# Altium schematic symbol library TI Amplifiers and Linear Special Function Amplifier.SchLib: 708 symbols (part 1 of 34) (continued)
## DRV102TG3 (continued)

## DRV103H
designator U?
PWM Low Side Driver (3 A) for Solenoids, Coils, Valves, Heaters, and Lamps, -40 to 85 degC, 8-pin SOP (DDA8), Green (RoHS & no Sb/Br); Manufacturer: Texas Instruments; PartNumber: DRV103H; Iq(mA): 0.4; Iq(Max)(mA): 0.8; Low Side: TRUE; Saturation Voltage(Max)(V): 0.6; Vs(Max)(V): 32; Vs(Min)(V): 8; DatasheetVersion: SBVS029A; PackageVersion: 4202561/F, 12/2011; PackageReference: DDA8-1775X1775TP; PackageDescription: 8-Pin PowerPAD(TM) Plastic Small Outline, Body 4.9 x 3.9 mm, Pitch 1.27 mm; Supplier 1: Digi-Key; Supplier Part Number 1: DRV103H-ND; Supplier 2: Farnell; Supplier Part Number 2: 1212388; Supplier 3: Newark; Supplier Part Number 3: 31C6363; Supplier 4: Mouser; Supplier Part Number 4: 595-DRV103H; Eco-Plan: Green (RoHS & no Sb/Br); Mounting Technology: Surface Mount; Code_JEDEC: MS-012; ComponentLink1Description: Manufacturer URL; ComponentLink1URL: http://www.ti.com/; ComponentLink2Description: Datasheet; ComponentLink2URL: http://www.ti.com/general/docs/lit/getliterature.tsp?genericPartNumber=DRV103&fileType=pdf; ComponentLink3Description: Package Specification; ComponentLink3URL: http://www.ti.com/litv/pdf/mpds092e
footprint TI-DDA8-1775X1775TP_N (SOP, 8-Leads, Body 4.9x3.9mm, Pitch 1.27mm, Thermal Pad 1.775x1.775mm, IPC Medium Density)
footprint TI-DDA8-1775X1775TP_L (SOP, 8-Leads, Body 4.9x3.9mm, Pitch 1.27mm, Thermal Pad 1.775x1.775mm, IPC High Density)
footprint TI-DDA8-1775X1775TP_M (SOP, 8-Leads, Body 4.9x3.9mm, Pitch 1.27mm, Thermal Pad 1.775x1.775mm, IPC Low Density)
pins: 1 DUTY CYCLE ADJ (in) "Internally, this pin connects to the input of a comparator and a (2.75 x IREF) current source from VS. The voltage at this node linearly sets the duty cycle. Duty cycle can be programmed with a resistor, analog voltage, or (See Datasheet)", 2 DELAY ADJ (in) "This pin sets the duration of the initial 100% duty cycle before the output goes into PWM mode. Leaving this pin floating results in a delay of approximately 18us, which is internally limited by parasitic capacitance. (See Datasheet)", 3 OSCILLATOR FREQUENCY ADJ (in) "PWM frequency is adjustable. A resistor to ground sets the current IREF and the internal PWM oscillator frequency. A range of 500Hz Frequency Adjust to 100kHz can be achieved with practical resistor values. Although (See Datasheet)", 4 GND (power) "This pin must be connected to system ground for the DRV103 to function. It carries the 0.4mA quiescent current plus the full load current when the power DMOS transistor is switched on.", 5 OUT (oc) "The output is the drain of a power DMOS transistor with its source connected to ground. Its low on-resistance (0.5ohm typ) assures low power dissipation in the DRV103. Gate drive to the power device is controlled to provide (See Datasheet)", 6 VS+ (power) "This is the power supply pin. Operating range is +8V to +32V. +VS must be >= the supply voltage to the load.", 7 ~{STATUS OK FLAG} (oc) "Normally HIGH (active LOW), a Flag LOW signals either an over-temperature or over-current fault. The over-current flag (Status OK) is LOW only when the output is ON (constant DC output or the “ON?portion of PWM mode)(See Datasheet)", 8 IN (in) "The input is compatible with standard TTL levels. The device output becomes enabled when the input voltage is driven above the typical switching threshold, 1.7V. Below this level, the output is disabled. Input current is (See Datasheet)", 9 EP "EXPOSED PAD"

## DRV103H/2K5
designator U?
PWM Low Side Driver (3 A) for Solenoids, Coils, Valves, Heaters, and Lamps, -40 to 85 degC, 8-pin SOP (DDA8), Green (RoHS & no Sb/Br); Manufacturer: Texas Instruments; PartNumber: DRV103H/2K5; Iq(mA): 0.4; Iq(Max)(mA): 0.8; Low Side: TRUE; Saturation Voltage(Max)(V): 0.6; Vs(Max)(V): 32; Vs(Min)(V): 8; DatasheetVersion: SBVS029A; PackageVersion: 4202561/F, 12/2011; PackageReference: DDA8-1775X1775TP; PackageDescription: 8-Pin PowerPAD(TM) Plastic Small Outline, Body 4.9 x 3.9 mm, Pitch 1.27 mm; Supplier 1: Digi-Key; Supplier Part Number 1: DRV103H/2K5TR-ND; Supplier 2: Digi-Key; Supplier Part Number 2: DRV103H/2K5CT-ND; Supplier 3: Digi-Key; Supplier Part Number 3: DRV103H/2K5DKR-ND; Supplier 4: Newark; Supplier Part Number 4: 74C9519; Supplier 5: Mouser; Supplier Part Number 5: 595-DRV103H/2K5; Eco-Plan: Green (RoHS & no Sb/Br); Mounting Technology: Surface Mount; Code_JEDEC: MS-012; ComponentLink1Description: Manufacturer URL; ComponentLink1URL: http://www.ti.com/; ComponentLink2Description: Datasheet; ComponentLink2URL: http://www.ti.com/general/docs/lit/getliterature.tsp?genericPartNumber=DRV103&fileType=pdf; ComponentLink3Description: Package Specification; ComponentLink3URL: http://www.ti.com/litv/pdf/mpds092e
footprint TI-DDA8-1775X1775TP_N (SOP, 8-Leads, Body 4.9x3.9mm, Pitch 1.27mm, Thermal Pad 1.775x1.775mm, IPC Medium Density)
footprint TI-DDA8-1775X1775TP_L (SOP, 8-Leads, Body 4.9x3.9mm, Pitch 1.27mm, Thermal Pad 1.775x1.775mm, IPC High Density)
footprint TI-DDA8-1775X1775TP_M (SOP, 8-Leads, Body 4.9x3.9mm, Pitch 1.27mm, Thermal Pad 1.775x1.775mm, IPC Low Density)
pins: 1 DUTY CYCLE ADJ (in) "Internally, this pin connects to the input of a comparator and a (2.75 x IREF) current source from VS. The voltage at this node linearly sets the duty cycle. Duty cycle can be programmed with a resistor, analog voltage, or (See Datasheet)", 2 DELAY ADJ (in) "This pin sets the duration of the initial 100% duty cycle before the output goes into PWM mode. Leaving this pin floating results in a delay of approximately 18us, which is internally limited by parasitic capacitance. (See Datasheet)", 3 OSCILLATOR FREQUENCY ADJ (in) "PWM frequency is adjustable. A resistor to ground sets the current IREF and the internal PWM oscillator frequency. A range of 500Hz Frequency Adjust to 100kHz can be achieved with practical resistor values. Although (See Datasheet)", 4 GND (power) "This pin must be connected to system ground for the DRV103 to function. It carries the 0.4mA quiescent current plus the full load current when the power DMOS transistor is switched on.", 5 OUT (oc) "The output is the drain of a power DMOS transistor with its source connected to ground. Its low on-resistance (0.5ohm typ) assures low power dissipation in the DRV103. Gate drive to the power device is controlled to provide (See Datasheet)", 6 VS+ (power) "This is the power supply pin. Operating range is +8V to +32V. +VS must be >= the supply voltage to the load.", 7 ~{STATUS OK FLAG} (oc) "Normally HIGH (active LOW), a Flag LOW signals either an over-temperature or over-current fault. The over-current flag (Status OK) is LOW only when the output is ON (constant DC output or the “ON?portion of PWM mode)(See Datasheet)", 8 IN (in) "The input is compatible with standard TTL levels. The device output becomes enabled when the input voltage is driven above the typical switching threshold, 1.7V. Below this level, the output is disabled. Input current is (See Datasheet)", 9 EP "EXPOSED PAD"

## DRV103H/2K5G3
designator U?
PWM Low Side Driver (3 A) for Solenoids, Coils, Valves, Heaters, and Lamps, -40 to 85 degC, 8-pin SOP (DDA8), Green (RoHS & no Sb/Br); Manufacturer: Texas Instruments; PartNumber: DRV103H/2K5G3; Iq(mA): 0.4; Iq(Max)(mA): 0.8; Low Side: TRUE; Saturation Voltage(Max)(V): 0.6; Vs(Max)(V): 32; Vs(Min)(V): 8; DatasheetVersion: SBVS029A; PackageVersion: 4202561/F, 12/2011; PackageReference: DDA8-1775X1775TP; PackageDescription: 8-Pin PowerPAD(TM) Plastic Small Outline, Body 4.9 x 3.9 mm, Pitch 1.27 mm; Supplier 1: Digi-Key; Supplier Part Number 1: DRV103H/2K5G3-ND; Supplier 2: Mouser; Supplier Part Number 2: 595-DRV103H/2K5G3; Eco-Plan: Green (RoHS & no Sb/Br); Mounting Technology: Surface Mount; Code_JEDEC: MS-012; ComponentLink1Description: Manufacturer URL; ComponentLink1URL: http://www.ti.com/; ComponentLink2Description: Datasheet; ComponentLink2URL: http://www.ti.com/general/docs/lit/getliterature.tsp?genericPartNumber=DRV103&fileType=pdf; ComponentLink3Description: Package Specification; ComponentLink3URL: http://www.ti.com/litv/pdf/mpds092e
footprint TI-DDA8-1775X1775TP_N (SOP, 8-Leads, Body 4.9x3.9mm, Pitch 1.27mm, Thermal Pad 1.775x1.775mm, IPC Medium Density)
footprint TI-DDA8-1775X1775TP_L (SOP, 8-Leads, Body 4.9x3.9mm, Pitch 1.27mm, Thermal Pad 1.775x1.775mm, IPC High Density)
footprint TI-DDA8-1775X1775TP_M (SOP, 8-Leads, Body 4.9x3.9mm, Pitch 1.27mm, Thermal Pad 1.775x1.775mm, IPC Low Density)
pins: 1 DUTY CYCLE ADJ (in) "Internally, this pin connects to the input of a comparator and a (2.75 x IREF) current source from VS. The voltage at this node linearly sets the duty cycle. Duty cycle can be programmed with a resistor, analog voltage, or (See Datasheet)", 2 DELAY ADJ (in) "This pin sets the duration of the initial 100% duty cycle before the output goes into PWM mode. Leaving this pin floating results in a delay of approximately 18us, which is internally limited by parasitic capacitance. (See Datasheet)", 3 OSCILLATOR FREQUENCY ADJ (in) "PWM frequency is adjustable. A resistor to ground sets the current IREF and the internal PWM oscillator frequency. A range of 500Hz Frequency Adjust to 100kHz can be achieved with practical resistor values. Although (See Datasheet)", 4 GND (power) "This pin must be connected to system ground for the DRV103 to function. It carries the 0.4mA quiescent current plus the full load current when the power DMOS transistor is switched on.", 5 OUT (oc) "The output is the drain of a power DMOS transistor with its source connected to ground. Its low on-resistance (0.5ohm typ) assures low power dissipation in the DRV103. Gate drive to the power device is controlled to provide (See Datasheet)", 6 VS+ (power) "This is the power supply pin. Operating range is +8V to +32V. +VS must be >= the supply voltage to the load.", 7 ~{STATUS OK FLAG} (oc) "Normally HIGH (active LOW), a Flag LOW signals either an over-temperature or over-current fault. The over-current flag (Status OK) is LOW only when the output is ON (constant DC output or the “ON?portion of PWM mode)(See Datasheet)", 8 IN (in) "The input is compatible with standard TTL levels. The device output becomes enabled when the input voltage is driven above the typical switching threshold, 1.7V. Below this level, the output is disabled. Input current is (See Datasheet)", 9 EP "EXPOSED PAD"

## DRV103HG3
designator U?
PWM Low Side Driver (3 A) for Solenoids, Coils, Valves, Heaters, and Lamps, -40 to 85 degC, 8-pin SOP (DDA8), Green (RoHS & no Sb/Br); Manufacturer: Texas Instruments; PartNumber: DRV103HG3; Iq(mA): 0.4; Iq(Max)(mA): 0.8; Low Side: TRUE; Saturation Voltage(Max)(V): 0.6; Vs(Max)(V): 32; Vs(Min)(V): 8; DatasheetVersion: SBVS029A; PackageVersion: 4202561/F, 12/2011; PackageReference: DDA8-1775X1775TP; PackageDescription: 8-Pin PowerPAD(TM) Plastic Small Outline, Body 4.9 x 3.9 mm, Pitch 1.27 mm; Supplier 1: Digi-Key; Supplier Part Number 1: DRV103HG3-ND; Supplier 2: Mouser; Supplier Part Number 2: 595-DRV103HG3; Eco-Plan: Green (RoHS & no Sb/Br); Mounting Technology: Surface Mount; Code_JEDEC: MS-012; ComponentLink1Description: Manufacturer URL; ComponentLink1URL: http://www.ti.com/; ComponentLink2Description: Datasheet; ComponentLink2URL: http://www.ti.com/general/docs/lit/getliterature.tsp?genericPartNumber=DRV103&fileType=pdf; ComponentLink3Description: Package Specification; ComponentLink3URL: http://www.ti.com/litv/pdf/mpds092e
footprint TI-DDA8-1775X1775TP_N (SOP, 8-Leads, Body 4.9x3.9mm, Pitch 1.27mm, Thermal Pad 1.775x1.775mm, IPC Medium Density)
footprint TI-DDA8-1775X1775TP_L (SOP, 8-Leads, Body 4.9x3.9mm, Pitch 1.27mm, Thermal Pad 1.775x1.775mm, IPC High Density)
footprint TI-DDA8-1775X1775TP_M (SOP, 8-Leads, Body 4.9x3.9mm, Pitch 1.27mm, Thermal Pad 1.775x1.775mm, IPC Low Density)
pins: 1 DUTY CYCLE ADJ (in) "Internally, this pin connects to the input of a comparator and a (2.75 x IREF) current source from VS. The voltage at this node linearly sets the duty cycle. Duty cycle can be programmed with a resistor, analog voltage, or (See Datasheet)", 2 DELAY ADJ (in) "This pin sets the duration of the initial 100% duty cycle before the output goes into PWM mode. Leaving this pin floating results in a delay of approximately 18us, which is internally limited by parasitic capacitance. (See Datasheet)", 3 OSCILLATOR FREQUENCY ADJ (in) "PWM frequency is adjustable. A resistor to ground sets the current IREF and the internal PWM oscillator frequency. A range of 500Hz Frequency Adjust to 100kHz can be achieved with practical resistor values. Although (See Datasheet)", 4 GND (power) "This pin must be connected to system ground for the DRV103 to function. It carries the 0.4mA quiescent current plus the full load current when the power DMOS transistor is switched on.", 5 OUT (oc) "The output is the drain of a power DMOS transistor with its source connected to ground. Its low on-resistance (0.5ohm typ) assures low power dissipation in the DRV103. Gate drive to the power device is controlled to provide (See Datasheet)", 6 VS+ (power) "This is the power supply pin. Operating range is +8V to +32V. +VS must be >= the supply voltage to the load.", 7 ~{STATUS OK FLAG} (oc) "Normally HIGH (active LOW), a Flag LOW signals either an over-temperature or over-current fault. The over-current flag (Status OK) is LOW only when the output is ON (constant DC output or the “ON?portion of PWM mode)(See Datasheet)", 8 IN (in) "The input is compatible with standard TTL levels. The device output becomes enabled when the input voltage is driven above the typical switching threshold, 1.7V. Below this level, the output is disabled. Input current is (See Datasheet)", 9 EP "EXPOSED PAD"

## DRV103U
designator U?
PWM Low Side Driver (1.5 A) for Solenoids, Coils, Valves, Heaters, and Lamps, -40 to 85 degC, 8-pin SOIC (D8), Green (RoHS & no Sb/Br); Manufacturer: Texas Instruments; PartNumber: DRV103U; Iq(mA): 0.4; Iq(Max)(mA): 0.8; Low Side: TRUE; Saturation Voltage(Max)(V): 0.6; Vs(Max)(V): 32; Vs(Min)(V): 8; DatasheetVersion: SBVS029A; PackageVersion: 4040047-3/M, 06/2011; PackageReference: D8; PackageDescription: 8-Pin Plastic Small Outline, Body 4.9 x 3.9 mm, Pitch 1.27 mm; Supplier 1: Digi-Key; Supplier Part Number 1: 296-11622-ND; Supplier 2: Newark; Supplier Part Number 2: 28X3372; Supplier 3: Newark; Supplier Part Number 3: 74C9520; Supplier 4: Mouser; Supplier Part Number 4: 595-DRV103U; Eco-Plan: Green (RoHS & no Sb/Br); Mounting Technology: Surface Mount; Code_JEDEC: MS-012; ComponentLink1Description: Manufacturer URL; ComponentLink1URL: http://www.ti.com/; ComponentLink2Description: Datasheet; ComponentLink2URL: http://www.ti.com/general/docs/lit/getliterature.tsp?genericPartNumber=DRV103&fileType=pdf; ComponentLink3Description: Package Specification; ComponentLink3URL: http://www.ti.com/litv/pdf/msoi002j
footprint TI-D8_N (SOIC, 8-Leads, Body 5x4mm, Pitch 1.27mm, IPC Medium Density)
footprint TI-D8_L (SOIC, 8-Leads, Body 5x4mm, Pitch 1.27mm, IPC High Density)
footprint TI-D8_M (SOIC, 8-Leads, Body 5x4mm, Pitch 1.27mm, IPC Low Density)
pins: 1 DUTY CYCLE ADJ (in) "Internally, this pin connects to the input of a comparator and a (2.75 x IREF) current source from VS. The voltage at this node linearly sets the duty cycle. Duty cycle can be programmed with a resistor, analog voltage, or (See Datasheet)", 2 DELAY ADJ (in) "This pin sets the duration of the initial 100% duty cycle before the output goes into PWM mode. Leaving this pin floating results in a delay of approximately 18us, which is internally limited by parasitic capacitance. (See Datasheet)", 3 OSCILLATOR FREQUENCY ADJ (in) "PWM frequency is adjustable. A resistor to ground sets the current IREF and the internal PWM oscillator frequency. A range of 500Hz to 100kHz can be achieved with practical resistor values. Although oscillator frequency (See Datasheet)", 4 GND (power) "This pin must be connected to system ground for the DRV103 to function. It carries the 0.4mA quiescent current plus the full load current when the power DMOS transistor is switched on.", 5 OUT (oc) "The output is the drain of a power DMOS transistor with its source connected to ground. Its low on-resistance (0.5ohm typ) assures low power dissipation in the DRV103. Gate drive to the power device is controlled to provide (See Datasheet)", 6 +VS (power) "This is the power supply pin. Operating range is +8V to +32V. +VS must be >= the supply voltage to the load.", 7 ~{STATUS OK FLAG} (oc) "Normally HIGH (active LOW), a Flag LOW signals either an over-temperature or over-current fault. The over-current flag (Status OK) is LOW only when the output is ON (constant DC output or the “ON” portion of PWM mode)(See Datasheet)", 8 INPUT (in) "The input is compatible with standard TTL levels. The device output becomes enabled when the input voltage is driven above the typical switching threshold, 1.7V. Below this level, the output is disabled. Input current is (See Datasheet)"

## DRV103U/2K5
designator U?
PWM Low Side Driver (1.5 A) for Solenoids, Coils, Valves, Heaters, and Lamps, -40 to 85 degC, 8-pin SOIC (D8), Green (RoHS & no Sb/Br); Manufacturer: Texas Instruments; PartNumber: DRV103U/2K5; Iq(mA): 0.4; Iq(Max)(mA): 0.8; Low Side: TRUE; Saturation Voltage(Max)(V): 0.6; Vs(Max)(V): 32; Vs(Min)(V): 8; DatasheetVersion: SBVS029A; PackageVersion: 4040047-3/M, 06/2011; PackageReference: D8; PackageDescription: 8-Pin Plastic Small Outline, Body 4.9 x 3.9 mm, Pitch 1.27 mm; Supplier 1: Digi-Key; Supplier Part Number 1: DRV103U/2K5-ND; Supplier 2: Mouser; Supplier Part Number 2: 595-DRV103U/2K5; Eco-Plan: Green (RoHS & no Sb/Br); Mounting Technology: Surface Mount; Code_JEDEC: MS-012; ComponentLink1Description: Manufacturer URL; ComponentLink1URL: http://www.ti.com/; ComponentLink2Description: Datasheet; ComponentLink2URL: http://www.ti.com/general/docs/lit/getliterature.tsp?genericPartNumber=DRV103&fileType=pdf; ComponentLink3Description: Package Specification; ComponentLink3URL: http://www.ti.com/litv/pdf/msoi002j
footprint TI-D8_N (SOIC, 8-Leads, Body 5x4mm, Pitch 1.27mm, IPC Medium Density)
footprint TI-D8_L (SOIC, 8-Leads, Body 5x4mm, Pitch 1.27mm, IPC High Density)
footprint TI-D8_M (SOIC, 8-Leads, Body 5x4mm, Pitch 1.27mm, IPC Low Density)
pins: 1 DUTY CYCLE ADJ (in) "Internally, this pin connects to the input of a comparator and a (2.75 x IREF) current source from VS. The voltage at this node linearly sets the duty cycle. Duty cycle can be programmed with a resistor, analog voltage, or (See Datasheet)", 2 DELAY ADJ (in) "This pin sets the duration of the initial 100% duty cycle before the output goes into PWM mode. Leaving this pin floating results in a delay of approximately 18us, which is internally limited by parasitic capacitance. (See Datasheet)", 3 OSCILLATOR FREQUENCY ADJ (in) "PWM frequency is adjustable. A resistor to ground sets the current IREF and the internal PWM oscillator frequency. A range of 500Hz to 100kHz can be achieved with practical resistor values. Although oscillator frequency (See Datasheet)", 4 GND (power) "This pin must be connected to system ground for the DRV103 to function. It carries the 0.4mA quiescent current plus the full load current when the power DMOS transistor is switched on.", 5 OUT (oc) "The output is the drain of a power DMOS transistor with its source connected to ground. Its low on-resistance (0.5ohm typ) assures low power dissipation in the DRV103. Gate drive to the power device is controlled to provide (See Datasheet)", 6 +VS (power) "This is the power supply pin. Operating range is +8V to +32V. +VS must be >= the supply voltage to the load.", 7 ~{STATUS OK FLAG} (oc) "Normally HIGH (active LOW), a Flag LOW signals either an over-temperature or over-current fault. The over-current flag (Status OK) is LOW only when the output is ON (constant DC output or the “ON” portion of PWM mode)(See Datasheet)", 8 INPUT (in) "The input is compatible with standard TTL levels. The device output becomes enabled when the input voltage is driven above the typical switching threshold, 1.7V. Below this level, the output is disabled. Input current is (See Datasheet)"

## DRV103U/2K5G4
designator U?
PWM Low Side Driver (1.5 A) for Solenoids, Coils, Valves, Heaters, and Lamps, -40 to 85 degC, 8-pin SOIC (D8), Green (RoHS & no Sb/Br); Manufacturer: Texas Instruments; PartNumber: DRV103U/2K5G4; Iq(mA): 0.4; Iq(Max)(mA): 0.8; Low Side: TRUE; Saturation Voltage(Max)(V): 0.6; Vs(Max)(V): 32; Vs(Min)(V): 8; DatasheetVersion: SBVS029A; PackageVersion: 4040047-3/M, 06/2011; PackageReference: D8; PackageDescription: 8-Pin Plastic Small Outline, Body 4.9 x 3.9 mm, Pitch 1.27 mm; Supplier 1: Digi-Key; Supplier Part Number 1: DRV103U/2K5G4-ND; Supplier 2: Mouser; Supplier Part Number 2: 595-DRV103U/2K5G4; Eco-Plan: Green (RoHS & no Sb/Br); Mounting Technology: Surface Mount; Code_JEDEC: MS-012; ComponentLink1Description: Manufacturer URL; ComponentLink1URL: http://www.ti.com/; ComponentLink2Description: Datasheet; ComponentLink2URL: http://www.ti.com/general/docs/lit/getliterature.tsp?genericPartNumber=DRV103&fileType=pdf; ComponentLink3Description: Package Specification; ComponentLink3URL: http://www.ti.com/litv/pdf/msoi002j
footprint TI-D8_N (SOIC, 8-Leads, Body 5x4mm, Pitch 1.27mm, IPC Medium Density)
footprint TI-D8_L (SOIC, 8-Leads, Body 5x4mm, Pitch 1.27mm, IPC High Density)
footprint TI-D8_M (SOIC, 8-Leads, Body 5x4mm, Pitch 1.27mm, IPC Low Density)
pins: 1 DUTY CYCLE ADJ (in) "Internally, this pin connects to the input of a comparator and a (2.75 x IREF) current source from VS. The voltage at this node linearly sets the duty cycle. Duty cycle can be programmed with a resistor, analog voltage, or (See Datasheet)", 2 DELAY ADJ (in) "This pin sets the duration of the initial 100% duty cycle before the output goes into PWM mode. Leaving this pin floating results in a delay of approximately 18us, which is internally limited by parasitic capacitance. (See Datasheet)", 3 OSCILLATOR FREQUENCY ADJ (in) "PWM frequency is adjustable. A resistor to ground sets the current IREF and the internal PWM oscillator frequency. A range of 500Hz to 100kHz can be achieved with practical resistor values. Although oscillator frequency (See Datasheet)", 4 GND (power) "This pin must be connected to system ground for the DRV103 to function. It carries the 0.4mA quiescent current plus the full load current when the power DMOS transistor is switched on.", 5 OUT (oc) "The output is the drain of a power DMOS transistor with its source connected to ground. Its low on-resistance (0.5ohm typ) assures low power dissipation in the DRV103. Gate drive to the power device is controlled to provide (See Datasheet)", 6 +VS (power) "This is the power supply pin. Operating range is +8V to +32V. +VS must be >= the supply voltage to the load.", 7 ~{STATUS OK FLAG} (oc) "Normally HIGH (active LOW), a Flag LOW signals either an over-temperature or over-current fault. The over-current flag (Status OK) is LOW only when the output is ON (constant DC output or the “ON” portion of PWM mode)(See Datasheet)", 8 INPUT (in) "The input is compatible with standard TTL levels. The device output becomes enabled when the input voltage is driven above the typical switching threshold, 1.7V. Below this level, the output is disabled. Input current is (See Datasheet)"

## DRV103UG4
designator U?
PWM Low Side Driver (1.5 A) for Solenoids, Coils, Valves, Heaters, and Lamps, -40 to 85 degC, 8-pin SOIC (D8), Green (RoHS & no Sb/Br); Manufacturer: Texas Instruments; PartNumber: DRV103UG4; Iq(mA): 0.4; Iq(Max)(mA): 0.8; Low Side: TRUE; Saturation Voltage(Max)(V): 0.6; Vs(Max)(V): 32; Vs(Min)(V): 8; DatasheetVersion: SBVS029A; PackageVersion: 4040047-3/M, 06/2011; PackageReference: D8; PackageDescription: 8-Pin Plastic Small Outline, Body 4.9 x 3.9 mm, Pitch 1.27 mm; Supplier 1: Digi-Key; Supplier Part Number 1: DRV103UG4-ND; Supplier 2: Farnell; Supplier Part Number 2: 1206892; Supplier 3: Newark; Supplier Part Number 3: 96K8702; Supplier 4: Mouser; Supplier Part Number 4: 595-DRV103UG4; Eco-Plan: Green (RoHS & no Sb/Br); Mounting Technology: Surface Mount; Code_JEDEC: MS-012; ComponentLink1Description: Manufacturer URL; ComponentLink1URL: http://www.ti.com/; ComponentLink2Description: Datasheet; ComponentLink2URL: http://www.ti.com/general/docs/lit/getliterature.tsp?genericPartNumber=DRV103&fileType=pdf; ComponentLink3Description: Package Specification; ComponentLink3URL: http://www.ti.com/litv/pdf/msoi002j
footprint TI-D8_N (SOIC, 8-Leads, Body 5x4mm, Pitch 1.27mm, IPC Medium Density)
footprint TI-D8_L (SOIC, 8-Leads, Body 5x4mm, Pitch 1.27mm, IPC High Density)
footprint TI-D8_M (SOIC, 8-Leads, Body 5x4mm, Pitch 1.27mm, IPC Low Density)
pins: 1 DUTY CYCLE ADJ (in) "Internally, this pin connects to the input of a comparator and a (2.75 x IREF) current source from VS. The voltage at this node linearly sets the duty cycle. Duty cycle can be programmed with a resistor, analog voltage, or (See Datasheet)", 2 DELAY ADJ (in) "This pin sets the duration of the initial 100% duty cycle before the output goes into PWM mode. Leaving this pin floating results in a delay of approximately 18us, which is internally limited by parasitic capacitance. (See Datasheet)", 3 OSCILLATOR FREQUENCY ADJ (in) "PWM frequency is adjustable. A resistor to ground sets the current IREF and the internal PWM oscillator frequency. A range of 500Hz to 100kHz can be achieved with practical resistor values. Although oscillator frequency (See Datasheet)", 4 GND (power) "This pin must be connected to system ground for the DRV103 to function. It carries the 0.4mA quiescent current plus the full load current when the power DMOS transistor is switched on.", 5 OUT (oc) "The output is the drain of a power DMOS transistor with its source connected to ground. Its low on-resistance (0.5ohm typ) assures low power dissipation in the DRV103. Gate drive to the power device is controlled to provide (See Datasheet)", 6 +VS (power) "This is the power supply pin. Operating range is +8V to +32V. +VS must be >= the supply voltage to the load.", 7 ~{STATUS OK FLAG} (oc) "Normally HIGH (active LOW), a Flag LOW signals either an over-temperature or over-current fault. The over-current flag (Status OK) is LOW only when the output is ON (constant DC output or the “ON” portion of PWM mode)(See Datasheet)", 8 INPUT (in) "The input is compatible with standard TTL levels. The device output becomes enabled when the input voltage is driven above the typical switching threshold, 1.7V. Below this level, the output is disabled. Input current is (See Datasheet)"

## DRV104PWP
designator U?
PWM High-Side Driver (1.2 A) for Solenoids, Coils, Valves, Heaters, and Lamps, -40 to 85 degC, 14-pin SOP (PWP14), Green (RoHS & no Sb/Br); Manufacturer: Texas Instruments; PartNumber: DRV104PWP; Iq(Max)(mA): 1; Output Current(Min)(A): 1.2; Saturation Voltage(Max)(V): 0.65; Vs(Max)(V): 32; Vs(Min)(V): 8; DatasheetVersion: SBVS036B; PackageVersion: 4073225-2/I, 05/2011; PackageReference: PWP14-1830X2055TP; PackageDescription: 14-Pin Plastic Small Outline, Body 4.4 x 5 mm, Pitch 0.65 mm; Supplier 1: Digi-Key; Supplier Part Number 1: 296-26053-5-ND; Supplier 2: Newark; Supplier Part Number 2: 01J0534; Supplier 3: Mouser; Supplier Part Number 3: 595-DRV104PWP; Eco-Plan: Green (RoHS & no Sb/Br); Mounting Technology: Surface Mount; Code_JEDEC: MO-153; ComponentLink1Description: Manufacturer URL; ComponentLink1URL: http://www.ti.com/; ComponentLink2Description: Datasheet; ComponentLink2URL: http://www.ti.com/general/docs/lit/getliterature.tsp?genericPartNumber=DRV104&fileType=pdf; ComponentLink3Description: Package Specification; ComponentLink3URL: http://www.ti.com/litv/pdf/mpds373
footprint TI-PWP14-1830X2055TP_N (SOP, 14-Leads, Body 5.1x4.5mm, Pitch 0.65mm, Thermal Pad 2.46x2.31mm, IPC Medium Density)
footprint TI-PWP14-1830X2055TP_L (SOP, 14-Leads, Body 5.1x4.5mm, Pitch 0.65mm, Thermal Pad 2.46x2.31mm, IPC High Density)
footprint TI-PWP14-1830X2055TP_M (SOP, 14-Leads, Body 5.1x4.5mm, Pitch 0.65mm, Thermal Pad 2.46x2.31mm, IPC Low Density)
pins: 1 DUTY CYCLE ADJ (in) "Internally, this pin connects to the input of a comparator and a (2.75 x IREF) current source from VS. The voltage at this node linearly sets the duty cycle. The duty cycle can be programmed with a resistor, analog voltage, (See Datasheet)", 2 DELAY ADJ (in) "This pin sets the duration of the initial 100% duty cycle before the output goes into PWM mode. Leaving this pin floating results in a delay of approximately 18us, which is internally limited by parasitic capacitance. (See Datasheet)", 3 OSC FREQ ADJ (in) "PWM frequency is adjustable. A resistor to ground sets the current IREF and the internal PWM oscillator frequency. A range of 500Hz Frequency Adjust to 100kHz can be achieved with practical resistor values. Although (See Datasheet)", 4 MASTER (in) "With no connection, this pin is driven to 5V by an internal 15uA current source. In this mode the device is the master and the SYNC pin becomes a 0V to 4.2V output, which is High when the power device is on. When the (See Datasheet)", 5 BOOT (out) "The bootstrap capacitor between this pin and the output, supplies the charge to provide the VGS necessary to turn on the power device. CBOOT should be larger than 100pF. Use of a smaller CBOOT may slow the output rise time, (See Datasheet)", 6 OUT1 (out) "The output is the source of a power DMOS transistor with its drain connected to VPS. Its low on-resistance (0.45ohm typ) assures low power dissipation in the DRV104. Gate drive to the power device is controlled to provide a (See Datasheet)", 7 OUT2 (out) "The output is the source of a power DMOS transistor with its drain connected to VPS. Its low on-resistance (0.45ohm typ) assures low power dissipation in the DRV104. Gate drive to the power device is controlled to provide a (See Datasheet)", 8 VPS2 (power) "These are the load power-supply pins to the drain of the power device. The load supply voltage may exceed the voltage at pin 10 by 5V, but must not exceed 37V.", 9 VPS1 (power) "These are the load power-supply pins to the drain of the power device. The load supply voltage may exceed the voltage at pin 10 by 5V, but must not exceed 37V.", 10 +VS (power) "This is the power-supply connection for all but the drain of the power device. The operating range is 8V to 32V.", 11 GND (power) "This pin must be connected to the system ground for the DRV104 to function. It does not carry the load current when the power DMOS device is switched on.", 12 SYNC (io) "The SYNC pin is a 0V to 4.2V copy of the output when the Master/Slave pin is High. As an output, it can supply 100uA with 1kohm output resistance. At 2mA, it current limits to either 4.2V or 0V. When the Master pin is Low, (See Datasheet)", 13 ~{STATUS OK FLAG} (oc) "Normally High (active Low), a Flag Low signals either an over-temperature or over-current fault. A thermal fault (thermal shutdown) occurs when the die surface reaches approximately 160degreesC and latches until the die (See Datasheet)", 14 IN (in) "The input is compatible with standard TTL levels. The device becomes enabled when the input voltage is driven above the typical switching threshold, 1.8V; below this level, the device is disabled. Input current is typically (See Datasheet)", 15 EP "Exposed Pad"

## DRV104PWPG4
designator U?
PWM High-Side Driver (1.2 A) for Solenoids, Coils, Valves, Heaters, and Lamps, -40 to 85 degC, 14-pin SOP (PWP14), Green (RoHS & no Sb/Br); Manufacturer: Texas Instruments; PartNumber: DRV104PWPG4; Iq(Max)(mA): 1; Output Current(Min)(A): 1.2; Saturation Voltage(Max)(V): 0.65; Vs(Max)(V): 32; Vs(Min)(V): 8; DatasheetVersion: SBVS036B; PackageVersion: 4073225-2/I, 05/2011; PackageReference: PWP14-1830X2055TP; PackageDescription: 14-Pin Plastic Small Outline, Body 4.4 x 5 mm, Pitch 0.65 mm; Supplier 1: Digi-Key; Supplier Part Number 1: DRV104PWPG4-ND; Supplier 2: Newark; Supplier Part Number 2: 28M5383; Supplier 3: Mouser; Supplier Part Number 3: 595-DRV104PWPG4; Eco-Plan: Green (RoHS & no Sb/Br); Mounting Technology: Surface Mount; Code_JEDEC: MO-153; ComponentLink1Description: Manufacturer URL; ComponentLink1URL: http://www.ti.com/; ComponentLink2Description: Datasheet; ComponentLink2URL: http://www.ti.com/general/docs/lit/getliterature.tsp?genericPartNumber=DRV104&fileType=pdf; ComponentLink3Description: Package Specification; ComponentLink3URL: http://www.ti.com/litv/pdf/mpds373
footprint TI-PWP14-1830X2055TP_N (SOP, 14-Leads, Body 5.1x4.5mm, Pitch 0.65mm, Thermal Pad 2.46x2.31mm, IPC Medium Density)
footprint TI-PWP14-1830X2055TP_L (SOP, 14-Leads, Body 5.1x4.5mm, Pitch 0.65mm, Thermal Pad 2.46x2.31mm, IPC High Density)
footprint TI-PWP14-1830X2055TP_M (SOP, 14-Leads, Body 5.1x4.5mm, Pitch 0.65mm, Thermal Pad 2.46x2.31mm, IPC Low Density)
pins: 1 DUTY CYCLE ADJ (in) "Internally, this pin connects to the input of a comparator and a (2.75 x IREF) current source from VS. The voltage at this node linearly sets the duty cycle. The duty cycle can be programmed with a resistor, analog voltage, (See Datasheet)", 2 DELAY ADJ (in) "This pin sets the duration of the initial 100% duty cycle before the output goes into PWM mode. Leaving this pin floating results in a delay of approximately 18us, which is internally limited by parasitic capacitance. (See Datasheet)", 3 OSC FREQ ADJ (in) "PWM frequency is adjustable. A resistor to ground sets the current IREF and the internal PWM oscillator frequency. A range of 500Hz Frequency Adjust to 100kHz can be achieved with practical resistor values. Although (See Datasheet)", 4 MASTER (in) "With no connection, this pin is driven to 5V by an internal 15uA current source. In this mode the device is the master and the SYNC pin becomes a 0V to 4.2V output, which is High when the power device is on. When the (See Datasheet)", 5 BOOT (out) "The bootstrap capacitor between this pin and the output, supplies the charge to provide the VGS necessary to turn on the power device. CBOOT should be larger than 100pF. Use of a smaller CBOOT may slow the output rise time, (See Datasheet)", 6 OUT1 (out) "The output is the source of a power DMOS transistor with its drain connected to VPS. Its low on-resistance (0.45ohm typ) assures low power dissipation in the DRV104. Gate drive to the power device is controlled to provide a (See Datasheet)", 7 OUT2 (out) "The output is the source of a power DMOS transistor with its drain connected to VPS. Its low on-resistance (0.45ohm typ) assures low power dissipation in the DRV104. Gate drive to the power device is controlled to provide a (See Datasheet)", 8 VPS2 (power) "These are the load power-supply pins to the drain of the power device. The load supply voltage may exceed the voltage at pin 10 by 5V, but must not exceed 37V.", 9 VPS1 (power) "These are the load power-supply pins to the drain of the power device. The load supply voltage may exceed the voltage at pin 10 by 5V, but must not exceed 37V.", 10 +VS (power) "This is the power-supply connection for all but the drain of the power device. The operating range is 8V to 32V.", 11 GND (power) "This pin must be connected to the system ground for the DRV104 to function. It does not carry the load current when the power DMOS device is switched on.", 12 SYNC (io) "The SYNC pin is a 0V to 4.2V copy of the output when the Master/Slave pin is High. As an output, it can supply 100uA with 1kohm output resistance. At 2mA, it current limits to either 4.2V or 0V. When the Master pin is Low, (See Datasheet)", 13 ~{STATUS OK FLAG} (oc) "Normally High (active Low), a Flag Low signals either an over-temperature or over-current fault. A thermal fault (thermal shutdown) occurs when the die surface reaches approximately 160degreesC and latches until the die (See Datasheet)", 14 IN (in) "The input is compatible with standard TTL levels. The device becomes enabled when the input voltage is driven above the typical switching threshold, 1.8V; below this level, the device is disabled. Input current is typically (See Datasheet)", 15 EP "Exposed Pad"